# Altium footprint library UWB_CAN_R2.PcbLib: 83 footprints (part 2 of 6)
Each footprint in its own frame and in the unit in brackets; x right, y up, seen from the top. Pads: shape width x height; smd on the part's side, far side on the other; paste and mask are expansions set on the pad; w line width, h text height; cw(c..) or ccw(c..) is an arc to the next point about the centre after c.
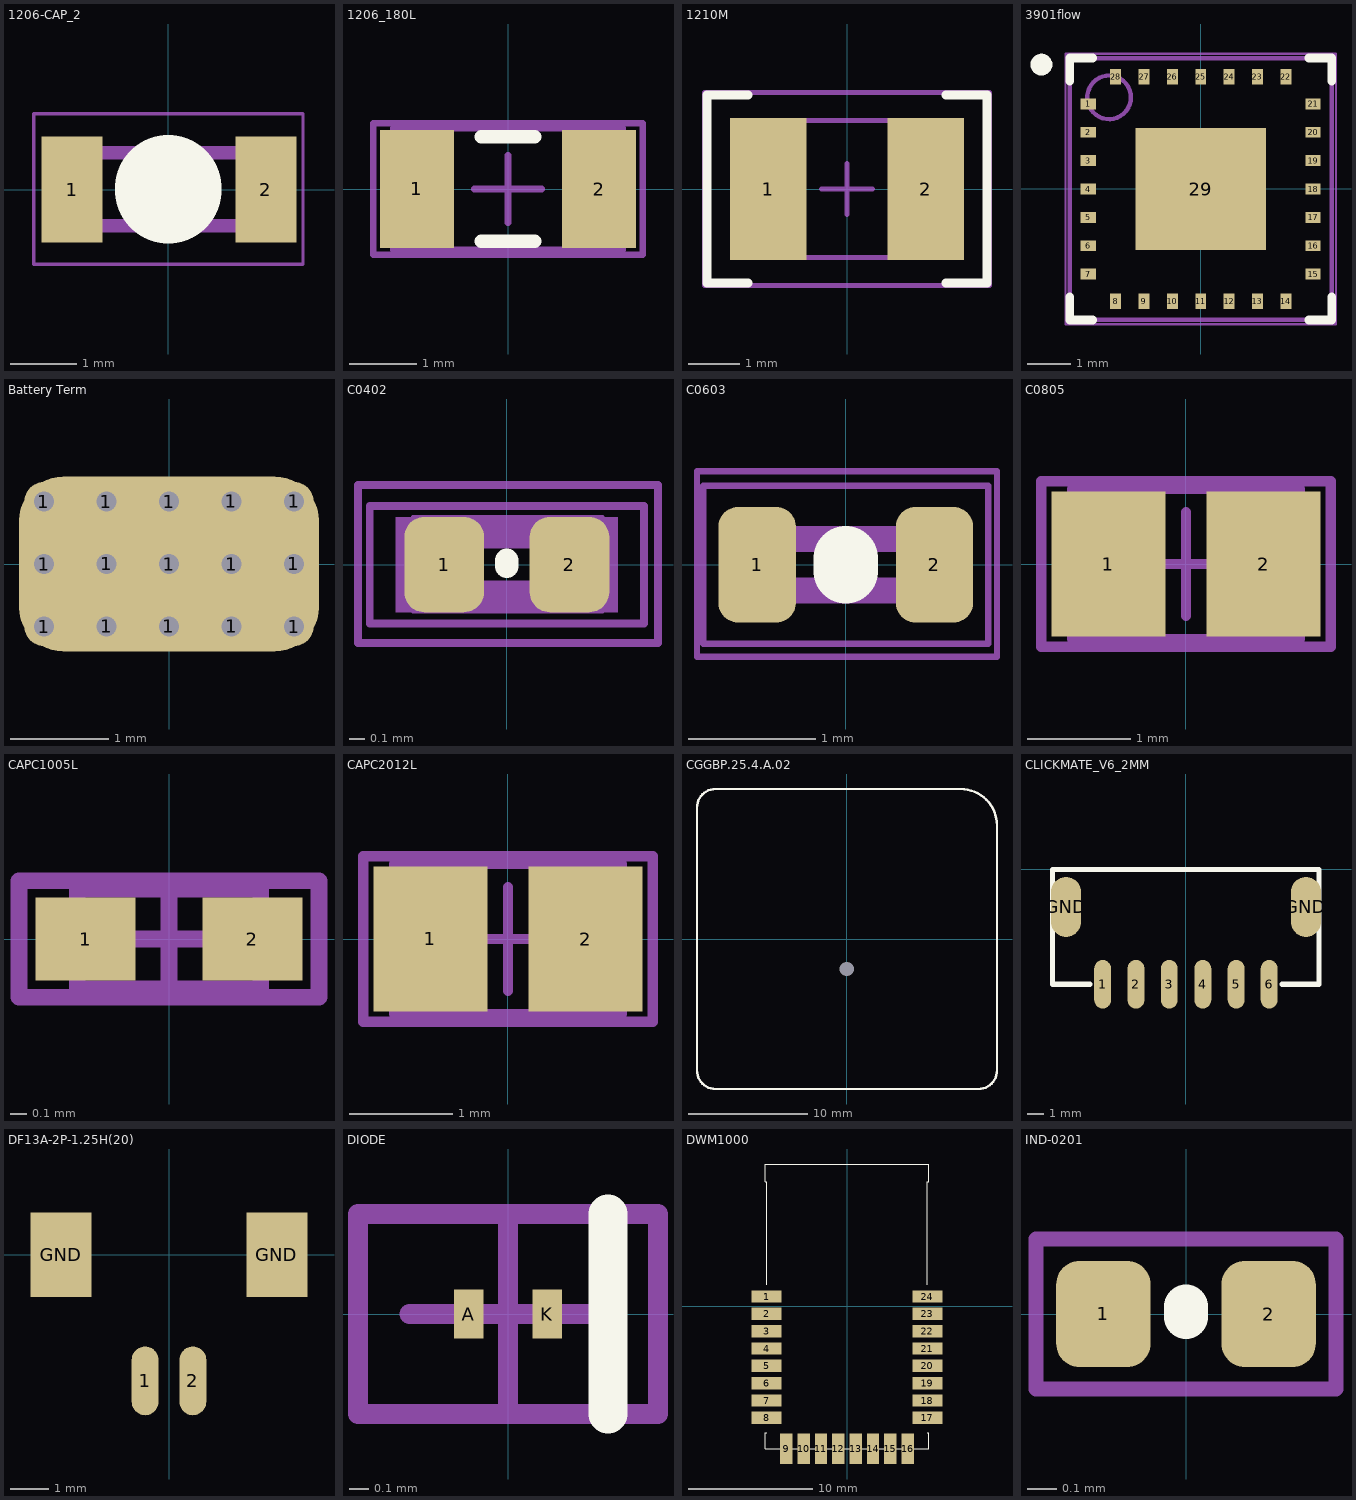
[diagram p1: the footprints below, top view; thin cyan lines are the x and y axes]

## 1206-CAP_2 [mil]
pads (2):
  rect 36x63 smd: 1(-57.09,0) 2(58,0)
Top Overlay:
  lines w63: 0,-0.39 0,1
Mechanical 16:
  rectangle: -68.87,-25.59 -45.24,26
  rectangle: 46.03,-25.59 69.03,26
  lines w2: -79.72,-44.29 80,-44.29 80,45 -79.72,45 -79.72,-44.29
  lines w8: -45.28,-21.59 46,-21.59 ; -45.27,22 46,22

## 1206_180L [mm] "1206_180"
height 1.8
pads (2):
  rect 1.1x1.75 smd: 1(-1.35,0) 2(1.35,0)
Top Overlay:
  lines w0.2: -0.4,-0.775 0.4,-0.775 ; -0.4,0.775 0.4,0.775
Mechanical 5:
  lines w0.1: -1.7,-0.9 -1.7,0.9 1.7,0.9 1.7,-0.9 -1.7,-0.9
Mechanical 15:
  lines w0.1: -0.5,0 0.5,0 ; 0,-0.5 0,0.5 ; -2,-0.975 -2,0.975 2,0.975 2,-0.975 -2,-0.975
3D body: height 1.8, standoff 0, extent 1.301,-0.949 1.75,0.95
3D body: height 1.8, standoff 0, extent -1.299,-0.949 1.3,0.95
3D body: height 1.8, standoff 0, extent -1.749,-0.949 -1.3,0.95

## 1210M [mm] "1210 from SM-752 data"
height 1.35
pads (2):
  rect 1.5x2.8 smd: 1(-1.55,0) 2(1.55,0)
Top Overlay:
  lines w0.178: -1.95,-1.85 -2.75,-1.85 -2.75,1.85 -1.95,1.85 ; 1.95,-1.85 2.75,-1.85 2.75,1.85 1.95,1.85
Mechanical 5:
  lines w0.1: -1.7,-1.35 1.7,-1.35 1.7,1.35 -1.7,1.35 -1.7,-1.35
Mechanical 13:
  lines w0.1: -1.2,-1.35 -1.2,1.35 ; 1.2,-1.35 1.2,1.35 ; -1.7,-1.35 -1.7,1.35 1.7,1.35 1.7,-1.35 -1.7,-1.35
Mechanical 15:
  lines w0.1: -0.5,0 0.5,0 ; 0,-0.5 0,0.5 ; -2.8,-1.9 2.8,-1.9 2.8,1.9 -2.8,1.9 -2.8,-1.9
3D body: height 1.35, standoff 0, extent -1.699,-1.349 -1.201,1.349
3D body: height 1.35, standoff 0, extent -1.199,-1.349 1.199,1.349
3D body: height 1.35, standoff 0, extent 1.201,-1.349 1.699,1.349

## 3901flow [mm]
height 2.33
pads (29):
  rect 0.35x0.25 smd: 1(-2.575,1.95) 2(-2.575,1.3) 3(-2.575,0.65) 4(-2.575,0) 5(-2.575,-0.65) 6(-2.575,-1.3) 7(-2.575,-1.95) 15(2.575,-1.95) 16(2.575,-1.3) 17(2.575,-0.65) 18(2.575,0) 19(2.575,0.65) 20(2.575,1.3) 21(2.575,1.95)
  rect 0.25x0.35 smd: 8(-1.95,-2.575) 9(-1.3,-2.575) 10(-0.65,-2.575) 11(0,-2.575) 12(0.65,-2.575) 13(1.3,-2.575) 14(1.95,-2.575) 22(1.95,2.575) 23(1.3,2.575) 24(0.65,2.575) 25(0,2.575) 26(-0.65,2.575) 27(-1.3,2.575) 28(-1.95,2.575)
  rect 3x2.8 smd: 29(0,0)
Top Overlay:
  circle w0.25: c-3.65,2.85 r0.125
  lines w0.2: -3,-2.475 -3,-3 -2.475,-3 ; -3,2.475 -3,3 -2.475,3 ; 2.475,-3 3,-3 3,-2.475 ; 2.475,3 3,3 3,2.475
Mechanical 13:
  circle w0.1: c-2.1,2.1 r0.5
  lines w0.1: -3,-3 -3,3 3,3 3,-3 -3,-3
Mechanical 15:
  lines w0.05: -3.1,-3.1 -3.1,3.1 3.1,3.1 3.1,-3.1 -3.1,-3.1
  lines w0.1: -0.5,0 0.5,0 ; 0,-0.5 0,0.5
3D body "3901FLOW.STEP": height 2.23, standoff 0, extent -3,-3 3,3

## Battery Term [mm]
height 1.1
pads (15):
  round 0.4 hole 0.2: 1(-1.27,0.635) 1(-1.27,0) 1(-1.27,-0.635) 1(-0.635,0.635) 1(-0.635,-0.635) 1(-0.635,0) 1(0,-0.635) 1(0,0.635) 1(0.635,0.635) 1(0.635,-0.635) 1(0.635,0) 1(1.27,0) 1(1.27,-0.635) 1(1.27,0.635)
  rrect50% 3.048x1.778 hole 0.2: 1(0,0)

## C0402 [mil]
height 43.31
pads (2):
  rrect50% 20x24 smd mask+0: 1(-15.75,0) 2(15.75,0)
Top Overlay:
  lines w6: 0,-0.39 0,1
Mechanical 2:
  lines w1.97: -34.45,-14.76 -34.45,14.76 34.45,14.76 34.45,-14.76 -34.45,-14.76
Mechanical 16:
  rectangle: -28.04,-12 -16.04,12
  rectangle: 15.96,-12 27.96,12
  lines w1: -23.62,-11.81 24,-11.81 24,12 -23.62,12 -23.62,-11.81
  lines w2: -37.4,-19.68 38,-19.68 38,20 -37.4,20 -37.4,-19.68
  lines w8: -20,-8 20,-8 ; -20,8 20,8
3D body "cap_0402.STEP": height 19.68, standoff 0, extent -19.69,-9.84 19.69,9.84

## C0603 [mil]
height 43.31
pads (2):
  rrect50% 24x36 smd mask+0: 1(-27.56,0) 2(27.56,0)
Top Overlay:
  lines w20: 0,-2 0,2
Mechanical 2:
  lines w1.97: -44.29,-24.61 -44.29,24.61 44.29,24.61 44.29,-24.61 -44.29,-24.61
Mechanical 16:
  rectangle: -28,-12 -16,12
  rectangle: 16,-12 28,12
  lines w2: -46.26,-28.54 47,-28.54 47,29 -46.26,29 -46.26,-28.54
  lines w8: -20,-8 20,-8 ; -20,8 20,8
3D body "cap_0603.STEP": height 34.25, standoff -0.39, extent -31.5,-15.95 31.5,15.94

## C0805 [mm] "Chip Capacitor, Body 2.0x1.3mm, IPC High Density"
height 1.4
pads (2):
  rect 1.1x1.4 smd: 1(-0.75,0) 2(0.75,0)
Mechanical 13:
  lines w0.1: -1.1,-0.725 -1.1,0.725 1.1,0.725 1.1,-0.725 -1.1,-0.725
Mechanical 15:
  lines w0.1: -0.5,0 0.5,0 ; 0,-0.5 0,0.5 ; -1.4,-0.8 -1.4,0.8 1.4,0.8 1.4,-0.8 -1.4,-0.8
3D body: height 1.4, standoff 0, extent -1.1,-0.725 1.1,0.725

## CAPC1005L [mm] "Chip Capacitor, Body 1.0x0.5mm, IPC High Density"
height 0.6
pads (2):
  rect 0.6x0.5 smd: 1(-0.5,0) 2(0.5,0)
Mechanical 13:
  lines w0.1: -0.55,-0.3 0.55,-0.3 0.55,0.3 -0.55,0.3 -0.55,-0.3
Mechanical 15:
  lines w0.1: -0.3,0 0.3,0 ; 0,-0.3 0,0.3 ; -0.9,-0.35 0.9,-0.35 0.9,0.35 -0.9,0.35 -0.9,-0.35
3D body: height 0.6, standoff 0, extent -0.55,-0.3 0.55,0.3

## CAPC2012L [mm] "Chip Capacitor, Body 2.0x1.3mm, IPC High Density"
height 1.1
pads (2):
  rect 1.1x1.4 smd: 1(-0.75,0) 2(0.75,0)
Mechanical 13:
  lines w0.1: -1.1,-0.725 1.1,-0.725 1.1,0.725 -1.1,0.725 -1.1,-0.725
Mechanical 15:
  lines w0.1: -0.5,0 0.5,0 ; 0,-0.5 0,0.5 ; -1.4,-0.8 1.4,-0.8 1.4,0.8 -1.4,0.8 -1.4,-0.8
3D body: height 1.1, standoff 0, extent -1.1,-0.725 1.1,0.725

## CGGBP.25.4.A.02 [mm] "CGGBP.25.4.A.02"
height 1.1
pads (1):
  round 0 / inner round 0 / far side round 2.5 hole 1.2: ANT(0,-2.5)
Top Overlay:
  lines w0.203: -12.55,-11 ccw(c-11,-11) -11,-12.55 11.024,-12.55 ccw(c11.023,-11) 12.573,-11 12.573,9.525 ccw(c9.525,9.525) 9.525,12.573 -11,12.573 ccw(c-11,11.023) -12.55,11.024 -12.55,-11
Bottom Overlay:
  lines w0.813: 9.525,9.627 ccw(c9.525,9.525) 9.525,9.627
Mechanical 16:
  lines w0.127: -12.55,-11 ccw(c-11,-11) -11,-12.55 11.024,-12.55 ccw(c11.023,-11) 12.573,-11 12.573,9.525 ccw(c9.525,9.525) 9.525,12.573 -11,12.573 ccw(c-11,11.023) -12.55,11.024 -12.55,-11
3D body "Taoglas.STEP": height 4.26, standoff -1.65, extent -12.55,-12.55 12.55,12.55

## CLICKMATE_V6_2MM [mil]
pads (8):
  rrect100% 40x115 smd: 1(-196.85,-271.65) 2(-118.11,-271.65) 3(-39.37,-271.65) 4(40,-271.65) 5(119,-271.65) 6(197,-271.65)
  rrect100% 71x142 smd: GND(-283.46,-88.58) GND(284,-88.58)
Top Overlay:
  lines w12: -226.38,-271.65 -314.96,-271.65 -314.96,0 315,0 315,-271.65 227,-271.65
  text "." at -225,-285 h155
3D body "5024430670.stp": height 294.65, standoff -0.62, extent -314.96,-303.31 314.96,-0.16

## DF13A-2P-1.25H(20) [mm]
pads (4):
  oval 0.7x1.8 smd: 1(-0.625,-3.3) 2(0.625,-3.3)
  rect 1.6x2.2 smd: GND(-2.825,0) GND(2.825,0)
3D body "DF13A-2P-1.25H.stp": height 3.68, standoff 0.08, extent -3.569,-3.809 3.581,2.691

## DIODE [mm]
height 0.4
pads (2):
  rect 0.15x0.25 smd: A(-0.2,0) K(0.2,0)
Top Overlay:
  lines w0.2: 0.508,-0.508 0.508,0.508
Mechanical 13:
  lines w0.1: -0.762,-0.508 0.762,-0.508 0.762,0.508 -0.762,0.508 -0.762,-0.508
Mechanical 15:
  lines w0.05: -0.762,-0.508 0.762,-0.508 0.762,0.508 -0.762,0.508 -0.762,-0.508
  lines w0.1: -0.5,0 0.5,0 ; 0,-0.5 0,0.5

## DWM1000 [mm] "DWM1000"
pads (24):
  rect 2.45x1 smd mask+0.05: 1(-6.5,0.8) 2(-6.5,-0.6) 3(-6.5,-2) 4(-6.5,-3.4) 5(-6.5,-4.8) 6(-6.5,-6.2) 7(-6.5,-7.6) 8(-6.5,-9) 17(6.5,-9) 18(6.5,-7.6) 19(6.5,-6.2) 20(6.5,-4.8) 21(6.5,-3.4) 22(6.5,-2) 23(6.5,-0.6) 24(6.5,0.8)
  rect 1x2.45 smd mask+0.05: 9(-4.9,-11.5) 10(-3.5,-11.5) 11(-2.1,-11.5) 12(-0.7,-11.5) 13(0.7,-11.5) 14(2.1,-11.5) 15(3.5,-11.5) 16(4.9,-11.5)
Top Overlay:
  lines w0.1: -6.5,-10.2 -6.6,-10.2 -6.6,-11.5 6.6,-11.5 6.6,-10.2 6.5,-10.2 ; -6.5,1.755 -6.5,10.05 -6.6,10.05 -6.6,11.5 6.6,11.5 6.6,10.05 6.5,10.05 6.5,1.755

## IND-0201 [mm]
height 1.1
pads (2):
  rrect50% 0.32x0.36 smd mask+0: 1(-0.28,0) 2(0.28,0)
Top Overlay:
  lines w0.15: 0,-0.01 0,0.025
Mechanical 16:
  lines w0.025: -0.508,-0.254 0.508,-0.254 0.508,0.254 -0.508,0.254 -0.508,-0.254
  lines w0.051: -0.508,-0.254 0.508,-0.254 0.508,0.254 -0.508,0.254 -0.508,-0.254
3D body "res_0201.step": height 0.12, standoff -0.12, extent -0.3,-0.15 0.3,0.15